# Altium footprint library Chestin_PcbLib.PcbLib: 203 footprints (part 8 of 13)
Each footprint in its own frame and in the unit in brackets; x right, y up, seen from the top. Pads: shape width x height; smd on the part's side, far side on the other; paste and mask are expansions set on the pad; w line width, h text height; cw(c..) or ccw(c..) is an arc to the next point about the centre after c.
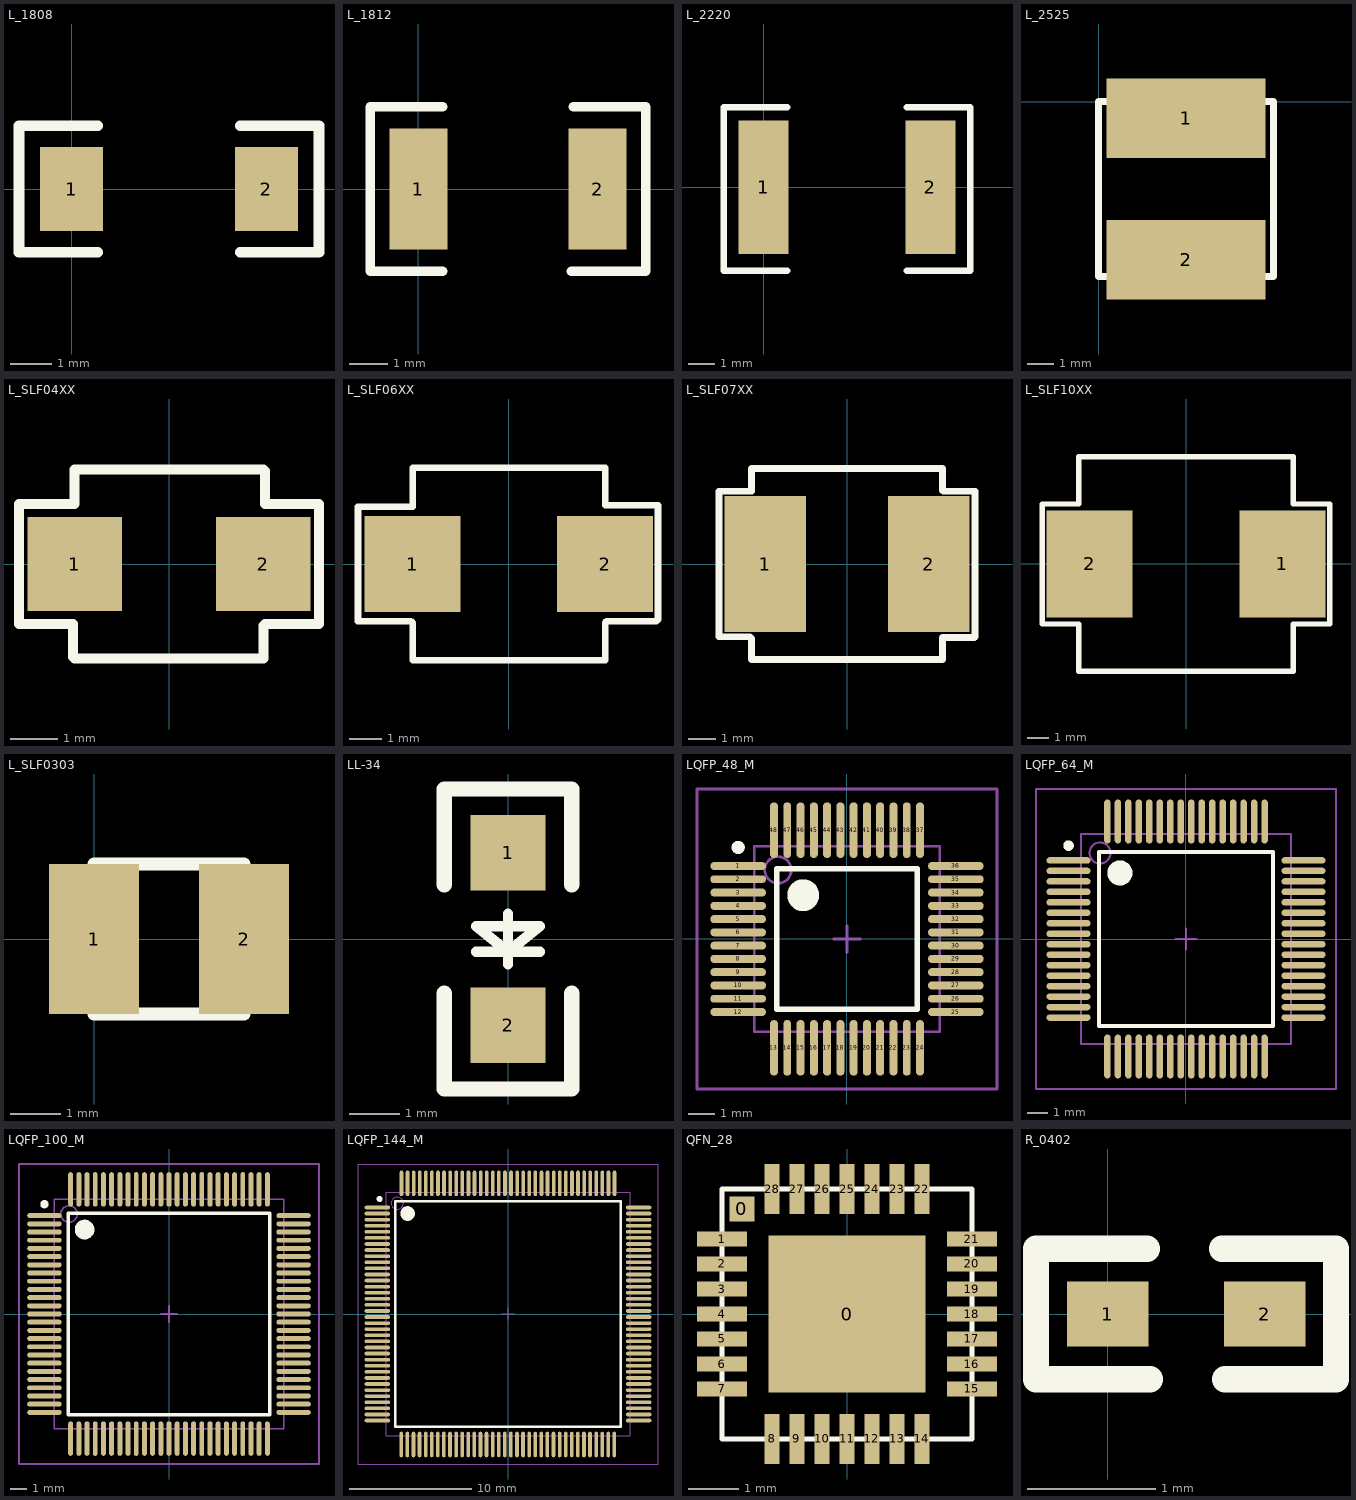
[diagram p7: the footprints below, top view; thin cyan lines are the x and y axes]

## L_1808 [mil]
pads (2):
  rect 60x80 smd: 1(0,0) 2(185,0)
Top Overlay:
  lines w10: 25,-60 -50,-60 -50,60 25,60 ; 160,-60 235,-60 235,60 160,60
3D body "R1808(4520M)1.STEP": height 39.37, standoff 0, extent 2,-39 179.77,37.49

## L_1812 [mil]
pads (2):
  rect 60x125 smd: 1(0,0) 2(185,0)
Top Overlay:
  lines w10: 25,-85 -50,-85 -50,85 25,85 ; 158,-85 160,-85 235,-85 235,85 160,85 ; 159,-85 161,-85
3D body "L1812.STEP": height 118.11, standoff -2.01, extent 1.89,-63 184.11,62.98

## L_2220 [mm]
pads (2):
  rect 1.905x5.08 smd: 1(0,0) 2(6.35,0)
Top Overlay:
  lines w0.254: 0.889,-3.175 -1.524,-3.175 -1.524,3.048 0.889,3.048 ; 5.461,-3.175 7.874,-3.175 7.874,3.048 5.461,3.048
3D body "L2220.STEP": height 2.5, standoff 0, extent 0.3,-2.489 6,2.511

## L_2525 [mm]
pads (2):
  rect 6x3 smd: 1(3.302,-0.635) 2(3.302,-5.969)
Top Overlay:
  lines w0.254: 0,-6.604 0,0 6.604,0 6.604,-6.604 0,-6.604
3D body "电": height 4.5, standoff -0.01, extent 0.702,-6.133 5.902,-0.42

## L_SLF04XX [mm]
pads (2):
  rect 2x2 smd: 1(-2,0) 2(2,0)
Top Overlay:
  lines w0.203: -2.032,-1.968 -2.032,-1.27 -3.175,-1.27 -3.175,1.27 -2,1.27 -2,2 2,2 2.032,1.968 2.032,1.27 3.175,1.27 3.175,-1.27 2.032,-1.27 2,-1.302 2,-2 -2,-2

## L_SLF06XX [mm]
pads (2):
  rect 3x3 smd: 1(-3,0) 2(3,0)
Top Overlay:
  lines w0.203: -4.699,-1.778 -3.048,-1.778 -3,-1.826 -3,-3 3,-3 3,-1.826 3.048,-1.778 4.603,-1.778 4.651,-1.73 4.651,1.826 3,1.826 3,3 -3,3 -3,1.778 -4.699,1.778 -4.699,-1.778

## L_SLF07XX [mm]
pads (2):
  rect 3x5 smd: 1(-3,0) 2(3,0)
Top Overlay:
  lines w0.254: 3.5,2.7 3.5,3.5 -3.5,3.5 -3.5,2.667 -4.699,2.667 -4.699,-2.667 -3.571,-2.667 -3.5,-2.738 -3.5,-3.5 3.5,-3.5 3.5,-2.7 4.666,-2.7 4.699,-2.667 4.699,2.667 3.533,2.667 3.683,2.667
3D body "CDRH.STEP": height 4.45, standoff -0.05, extent -3.65,-3.65 3.65,3.65

## L_SLF10XX [mm]
pads (2):
  rect 4x5 smd: 1(4.5,0) 2(-4.5,0)
Top Overlay:
  lines w0.254: 6.706,2.769 6.706,-2.8 5,-2.8 5,-5 -5,-5 -5,-2.8 -6.706,-2.8 -6.706,2.8 -5,2.8 -5,5 5,5 5,2.8 6.706,2.8
3D body "SL10X10.STEP": height 4.5, standoff 0, extent -5.047,-4.996 4.953,5.004

## L_SLF0303 [mm]
pads (2):
  rect 1.8x3 smd: 1(0,0) 2(3,0)
Top Overlay:
  lines w0.254: 0,-1.5 3,-1.5 ; 0,1.5 3,1.5
3D body "零件1.STEP": height 3, standoff 1.9, extent -0.076,-1.5 3.124,1.5

## LL-34 [mm]
pads (2):
  rect 1.5x1.5 smd: 1(0,1.714) 2(0,-1.714)
Top Overlay:
  lines w0.203: -0.635,-0.254 0.635,-0.254 ; 0,-0.508 0,0.508 ; -0.635,0.254 0.635,0.254 0,-0.254 -0.635,0.254
  lines w0.305: -1.27,-1.079 -1.27,-2.984 1.27,-2.984 1.27,-1.079 ; -1.27,1.079 -1.27,2.984 1.27,2.984 1.27,1.079
3D body "User Library-smd diode 1206.STEP": height 1.43, standoff -0.02, extent -0.725,-1.75 0.725,1.75

## LQFP_48_M [mm] "Thin QFP, 48-Leads, Body 7x7mm, Pitch 0.5mm, IPC Low Density"
height 1.6
pads (48):
  oval 2.1x0.3 smd: 1(-4.1,2.75) 2(-4.1,2.25) 3(-4.1,1.75) 4(-4.1,1.25) 5(-4.1,0.75) 6(-4.1,0.25) 7(-4.1,-0.25) 8(-4.1,-0.75) 9(-4.1,-1.25) 10(-4.1,-1.75) 11(-4.1,-2.25) 12(-4.1,-2.75) 25(4.1,-2.75) 26(4.1,-2.25) 27(4.1,-1.75) 28(4.1,-1.25) 29(4.1,-0.75) 30(4.1,-0.25) 31(4.1,0.25) 32(4.1,0.75) 33(4.1,1.25) 34(4.1,1.75) 35(4.1,2.25) 36(4.1,2.75)
  oval 0.3x2.1 smd: 13(-2.75,-4.1) 14(-2.25,-4.1) 15(-1.75,-4.1) 16(-1.25,-4.1) 17(-0.75,-4.1) 18(-0.25,-4.1) 19(0.25,-4.1) 20(0.75,-4.1) 21(1.25,-4.1) 22(1.75,-4.1) 23(2.25,-4.1) 24(2.75,-4.1) 37(2.75,4.1) 38(2.25,4.1) 39(1.75,4.1) 40(1.25,4.1) 41(0.75,4.1) 42(0.25,4.1) 43(-0.25,4.1) 44(-0.75,4.1) 45(-1.25,4.1) 46(-1.75,4.1) 47(-2.25,4.1) 48(-2.75,4.1)
Top Overlay:
  circle w0.6: c-1.65,1.65 r0.3
  circle w0.25: c-4.1,3.45 r0.125
  lines w0.2: -2.65,-2.65 2.65,-2.65 2.65,2.65 -2.65,2.65 -2.65,-2.65
Mechanical 13:
  circle w0.1: c-2.6,2.6 r0.5
  lines w0.1: -3.5,-3.5 3.5,-3.5 3.5,3.5 -3.5,3.5 -3.5,-3.5
Mechanical 15:
  lines w0.1: -0.5,0 0.5,0 ; 0,-0.5 0,0.5 ; -5.65,-5.65 5.65,-5.65 5.65,5.65 -5.65,5.65 -5.65,-5.65
3D body: height 1.6, standoff 0, extent -3.5,-3.5 3.5,3.5

## LQFP_64_M [mm] "Thin QFP, 64-Leads, Body 10x10mm, Pitch 0.5mm, IPC Low Density"
height 1.6
pads (64):
  oval 2.1x0.3 smd: 1(-5.6,3.75) 2(-5.6,3.25) 3(-5.6,2.75) 4(-5.6,2.25) 5(-5.6,1.75) 6(-5.6,1.25) 7(-5.6,0.75) 8(-5.6,0.25) 9(-5.6,-0.25) 10(-5.6,-0.75) 11(-5.6,-1.25) 12(-5.6,-1.75) 13(-5.6,-2.25) 14(-5.6,-2.75) 15(-5.6,-3.25) 16(-5.6,-3.75) 33(5.6,-3.75) 34(5.6,-3.25) 35(5.6,-2.75) 36(5.6,-2.25) 37(5.6,-1.75) 38(5.6,-1.25) 39(5.6,-0.75) 40(5.6,-0.25) 41(5.6,0.25) 42(5.6,0.75) 43(5.6,1.25) 44(5.6,1.75) 45(5.6,2.25) 46(5.6,2.75) 47(5.6,3.25) 48(5.6,3.75)
  oval 0.3x2.1 smd: 17(-3.75,-5.6) 18(-3.25,-5.6) 19(-2.75,-5.6) 20(-2.25,-5.6) 21(-1.75,-5.6) 22(-1.25,-5.6) 23(-0.75,-5.6) 24(-0.25,-5.6) 25(0.25,-5.6) 26(0.75,-5.6) 27(1.25,-5.6) 28(1.75,-5.6) 29(2.25,-5.6) 30(2.75,-5.6) 31(3.25,-5.6) 32(3.75,-5.6) 49(3.75,5.6) 50(3.25,5.6) 51(2.75,5.6) 52(2.25,5.6) 53(1.75,5.6) 54(1.25,5.6) 55(0.75,5.6) 56(0.25,5.6) 57(-0.25,5.6) 58(-0.75,5.6) 59(-1.25,5.6) 60(-1.75,5.6) 61(-2.25,5.6) 62(-2.75,5.6) 63(-3.25,5.6) 64(-3.75,5.6)
Top Overlay:
  circle w0.6: c-3.15,3.15 r0.3
  circle w0.25: c-5.6,4.45 r0.125
  lines w0.2: -4.15,-4.15 4.15,-4.15 4.15,4.15 -4.15,4.15 -4.15,-4.15
Mechanical 13:
  circle w0.1: c-4.1,4.1 r0.5
  lines w0.1: -5,-5 5,-5 5,5 -5,5 -5,-5
Mechanical 15:
  lines w0.1: -0.5,0 0.5,0 ; 0,-0.5 0,0.5 ; -7.15,-7.15 7.15,-7.15 7.15,7.15 -7.15,7.15 -7.15,-7.15
3D body: height 1.6, standoff 0, extent -5,-5 5,5

## LQFP_100_M [mm] "Thin QFP, 100-Leads, Body 14x14mm, Pitch 0.5mm, IPC Low Density"
height 1.6
pads (100):
  oval 2.1x0.3 smd: 1(-7.6,6) 2(-7.6,5.5) 3(-7.6,5) 4(-7.6,4.5) 5(-7.6,4) 6(-7.6,3.5) 7(-7.6,3) 8(-7.6,2.5) 9(-7.6,2) 10(-7.6,1.5) 11(-7.6,1) 12(-7.6,0.5) 13(-7.6,0) 14(-7.6,-0.5) 15(-7.6,-1) 16(-7.6,-1.5) 17(-7.6,-2) 18(-7.6,-2.5) 19(-7.6,-3) 20(-7.6,-3.5) 21(-7.6,-4) 22(-7.6,-4.5) 23(-7.6,-5) 24(-7.6,-5.5) 25(-7.6,-6) 51(7.6,-6) 52(7.6,-5.5) 53(7.6,-5) 54(7.6,-4.5) 55(7.6,-4) 56(7.6,-3.5) 57(7.6,-3) 58(7.6,-2.5) 59(7.6,-2) 60(7.6,-1.5) 61(7.6,-1) 62(7.6,-0.5) 63(7.6,0) 64(7.6,0.5) 65(7.6,1) 66(7.6,1.5) 67(7.6,2) 68(7.6,2.5) 69(7.6,3) 70(7.6,3.5) 71(7.6,4) 72(7.6,4.5) 73(7.6,5) 74(7.6,5.5) 75(7.6,6)
  oval 0.3x2.1 smd: 26(-6,-7.6) 27(-5.5,-7.6) 28(-5,-7.6) 29(-4.5,-7.6) 30(-4,-7.6) 31(-3.5,-7.6) 32(-3,-7.6) 33(-2.5,-7.6) 34(-2,-7.6) 35(-1.5,-7.6) 36(-1,-7.6) 37(-0.5,-7.6) 38(0,-7.6) 39(0.5,-7.6) 40(1,-7.6) 41(1.5,-7.6) 42(2,-7.6) 43(2.5,-7.6) 44(3,-7.6) 45(3.5,-7.6) 46(4,-7.6) 47(4.5,-7.6) 48(5,-7.6) 49(5.5,-7.6) 50(6,-7.6) 76(6,7.6) 77(5.5,7.6) 78(5,7.6) 79(4.5,7.6) 80(4,7.6) 81(3.5,7.6) 82(3,7.6) 83(2.5,7.6) 84(2,7.6) 85(1.5,7.6) 86(1,7.6) 87(0.5,7.6) 88(0,7.6) 89(-0.5,7.6) 90(-1,7.6) 91(-1.5,7.6) 92(-2,7.6) 93(-2.5,7.6) 94(-3,7.6) 95(-3.5,7.6) 96(-4,7.6) 97(-4.5,7.6) 98(-5,7.6) 99(-5.5,7.6) 100(-6,7.6)
Top Overlay:
  circle w0.25: c-7.6,6.7 r0.125
  circle w0.6: c-5.15,5.15 r0.3
  lines w0.2: -6.15,-6.15 -6.15,6.15 6.15,6.15 6.15,-6.15 -6.15,-6.15
Mechanical 13:
  circle w0.1: c-6.1,6.1 r0.5
  lines w0.1: -7,-7 -7,7 7,7 7,-7 -7,-7
Mechanical 15:
  lines w0.1: -0.5,0 0.5,0 ; 0,-0.5 0,0.5 ; -9.15,-9.15 -9.15,9.15 9.15,9.15 9.15,-9.15 -9.15,-9.15
3D body: height 1.6, standoff 0, extent -7,-7 7,7

## LQFP_144_M [mm]
pads (144):
  oval 2.1x0.3 smd: 1(-10.728,8.75) 2(-10.728,8.25) 3(-10.728,7.75) 4(-10.728,7.25) 5(-10.728,6.75) 6(-10.728,6.25) 7(-10.728,5.75) 8(-10.728,5.25) 9(-10.728,4.75) 10(-10.728,4.25) 11(-10.728,3.75) 12(-10.728,3.25) 13(-10.728,2.75) 14(-10.728,2.25) 15(-10.728,1.75) 16(-10.728,1.25) 17(-10.728,0.75) 18(-10.728,0.25) 19(-10.728,-0.25) 20(-10.728,-0.75) 21(-10.728,-1.25) 22(-10.728,-1.75) 23(-10.728,-2.25) 24(-10.728,-2.75) 25(-10.728,-3.25) 26(-10.728,-3.75) 27(-10.728,-4.25) 28(-10.728,-4.75) 29(-10.728,-5.25) 30(-10.728,-5.75) 31(-10.728,-6.25) 32(-10.728,-6.75) 33(-10.728,-7.25) 34(-10.728,-7.75) 35(-10.728,-8.25) 36(-10.728,-8.75) 73(10.728,-8.75) 74(10.728,-8.25) 75(10.728,-7.75) 76(10.728,-7.25) 77(10.728,-6.75) 78(10.728,-6.25) 79(10.728,-5.75) 80(10.728,-5.25) 81(10.728,-4.75) 82(10.728,-4.25) 83(10.728,-3.75) 84(10.728,-3.25) 85(10.728,-2.75) 86(10.728,-2.25) 87(10.728,-1.75) 88(10.728,-1.25) 89(10.728,-0.75) 90(10.728,-0.25) 91(10.728,0.25) 92(10.728,0.75) 93(10.728,1.25) 94(10.728,1.75) 95(10.728,2.25) 96(10.728,2.75) 97(10.728,3.25) 98(10.728,3.75) 99(10.728,4.25) 100(10.728,4.75) 101(10.728,5.25) 102(10.728,5.75) 103(10.728,6.25) 104(10.728,6.75) 105(10.728,7.25) 106(10.728,7.75) 107(10.728,8.25) 108(10.728,8.75)
  oval 0.3x2.1 smd: 37(-8.763,-10.719) 38(-8.263,-10.719) 39(-7.763,-10.719) 40(-7.263,-10.719) 41(-6.763,-10.719) 42(-6.263,-10.719) 43(-5.763,-10.719) 44(-5.263,-10.719) 45(-4.763,-10.719) 46(-4.263,-10.719) 47(-3.763,-10.719) 48(-3.263,-10.719) 49(-2.763,-10.719) 50(-2.263,-10.719) 51(-1.763,-10.719) 52(-1.263,-10.719) 53(-0.763,-10.719) 54(-0.263,-10.719) 55(0.237,-10.719) 56(0.737,-10.719) 57(1.237,-10.719) 58(1.737,-10.719) 59(2.237,-10.719) 60(2.737,-10.719) 61(3.237,-10.719) 62(3.737,-10.719) 63(4.237,-10.719) 64(4.737,-10.719) 65(5.237,-10.719) 66(5.737,-10.719) 67(6.237,-10.719) 68(6.737,-10.719) 69(7.237,-10.719) 70(7.737,-10.719) 71(8.237,-10.719) 72(8.737,-10.719) 109(8.75,10.728) 110(8.25,10.728) 111(7.75,10.728) 112(7.25,10.728) 113(6.75,10.728) 114(6.25,10.728) 115(5.75,10.728) 116(5.25,10.728) 117(4.75,10.728) 118(4.25,10.728) 119(3.75,10.728) 120(3.25,10.728) 121(2.75,10.728) 122(2.25,10.728) 123(1.75,10.728) 124(1.25,10.728) 125(0.75,10.728) 126(0.25,10.728) 127(-0.25,10.728) 128(-0.75,10.728) 129(-1.25,10.728) 130(-1.75,10.728) 131(-2.25,10.728) 132(-2.75,10.728) 133(-3.25,10.728) 134(-3.75,10.728) 135(-4.25,10.728) 136(-4.75,10.728) 137(-5.25,10.728) 138(-5.75,10.728) 139(-6.25,10.728) 140(-6.75,10.728) 141(-7.25,10.728) 142(-7.75,10.728) 143(-8.25,10.728) 144(-8.75,10.728)
Top Overlay:
  circle w0.6: c-8.25,8.25 r0.3
  circle w0.25: c-10.55,9.45 r0.125
  lines w0.2: -9.25,-9.25 9.25,-9.25 9.25,9.25 -9.25,9.25 -9.25,-9.25
Mechanical 13:
  circle w0.1: c-9.1,9.1 r0.5
  lines w0.1: -10,-10 10,-10 10,10 -10,10 -10,-10
Mechanical 15:
  lines w0.1: -0.5,0 0.5,0 ; 0,-0.5 0,0.5 ; -12.319,-12.319 12.319,-12.319 12.319,12.319 -12.319,12.319 -12.319,-12.319
3D body: height 1.6, standoff 0, extent -10,-10 10,10

## QFN_28 [mm] "CP2102_GMR"
pads (30):
  rect 0.5x0.5 smd: 0(-2.1,2.1)
  rect 3.15x3.15 smd: 0(0,0)
  rect 1x0.3 smd: 1(-2.5,1.5) 2(-2.5,1) 3(-2.5,0.5) 4(-2.5,0) 5(-2.5,-0.5) 6(-2.5,-1) 7(-2.5,-1.5) 15(2.5,-1.5) 16(2.5,-1) 17(2.5,-0.5) 18(2.5,0) 19(2.5,0.5) 20(2.5,1) 21(2.5,1.5)
  rect 0.3x1 smd: 8(-1.5,-2.5) 9(-1,-2.5) 10(-0.5,-2.5) 11(0,-2.5) 12(0.5,-2.5) 13(1,-2.5) 14(1.5,-2.5) 22(1.5,2.5) 23(1,2.5) 24(0.5,2.5) 25(0,2.5) 26(-0.5,2.5) 27(-1,2.5) 28(-1.5,2.5)
Top Overlay:
  lines w0.1: -2.5,-2.5 -2.5,2.5 2.5,2.5 2.5,-2.5 -2.5,-2.5
3D body "CP2102-GMR.STEP": height 0.92, standoff 0, extent -2.5,-2.5 2.5,2.5

## R_0402 [mil] "1/16W"
pads (2):
  rect 25x20 smd: 1(0,0) 2(48.2,0)
Top Overlay:
  lines w8: 12,20 -22,20 -22,-20 13,-20 ; 35,20 70,20 70,-20 36,-20
3D body "R0402.STEP": height 13.78, standoff 0, extent 4.71,-9.79 44.09,9.9